# Altium footprint library UP-ROBOT Devices(2013-02-26).PcbLib: 150 footprints (part 2 of 10)
Each footprint in its own frame and in the unit in brackets; x right, y up, seen from the top. Pads: shape width x height; smd on the part's side, far side on the other; paste and mask are expansions set on the pad; w line width, h text height; cw(c..) or ccw(c..) is an arc to the next point about the centre after c.
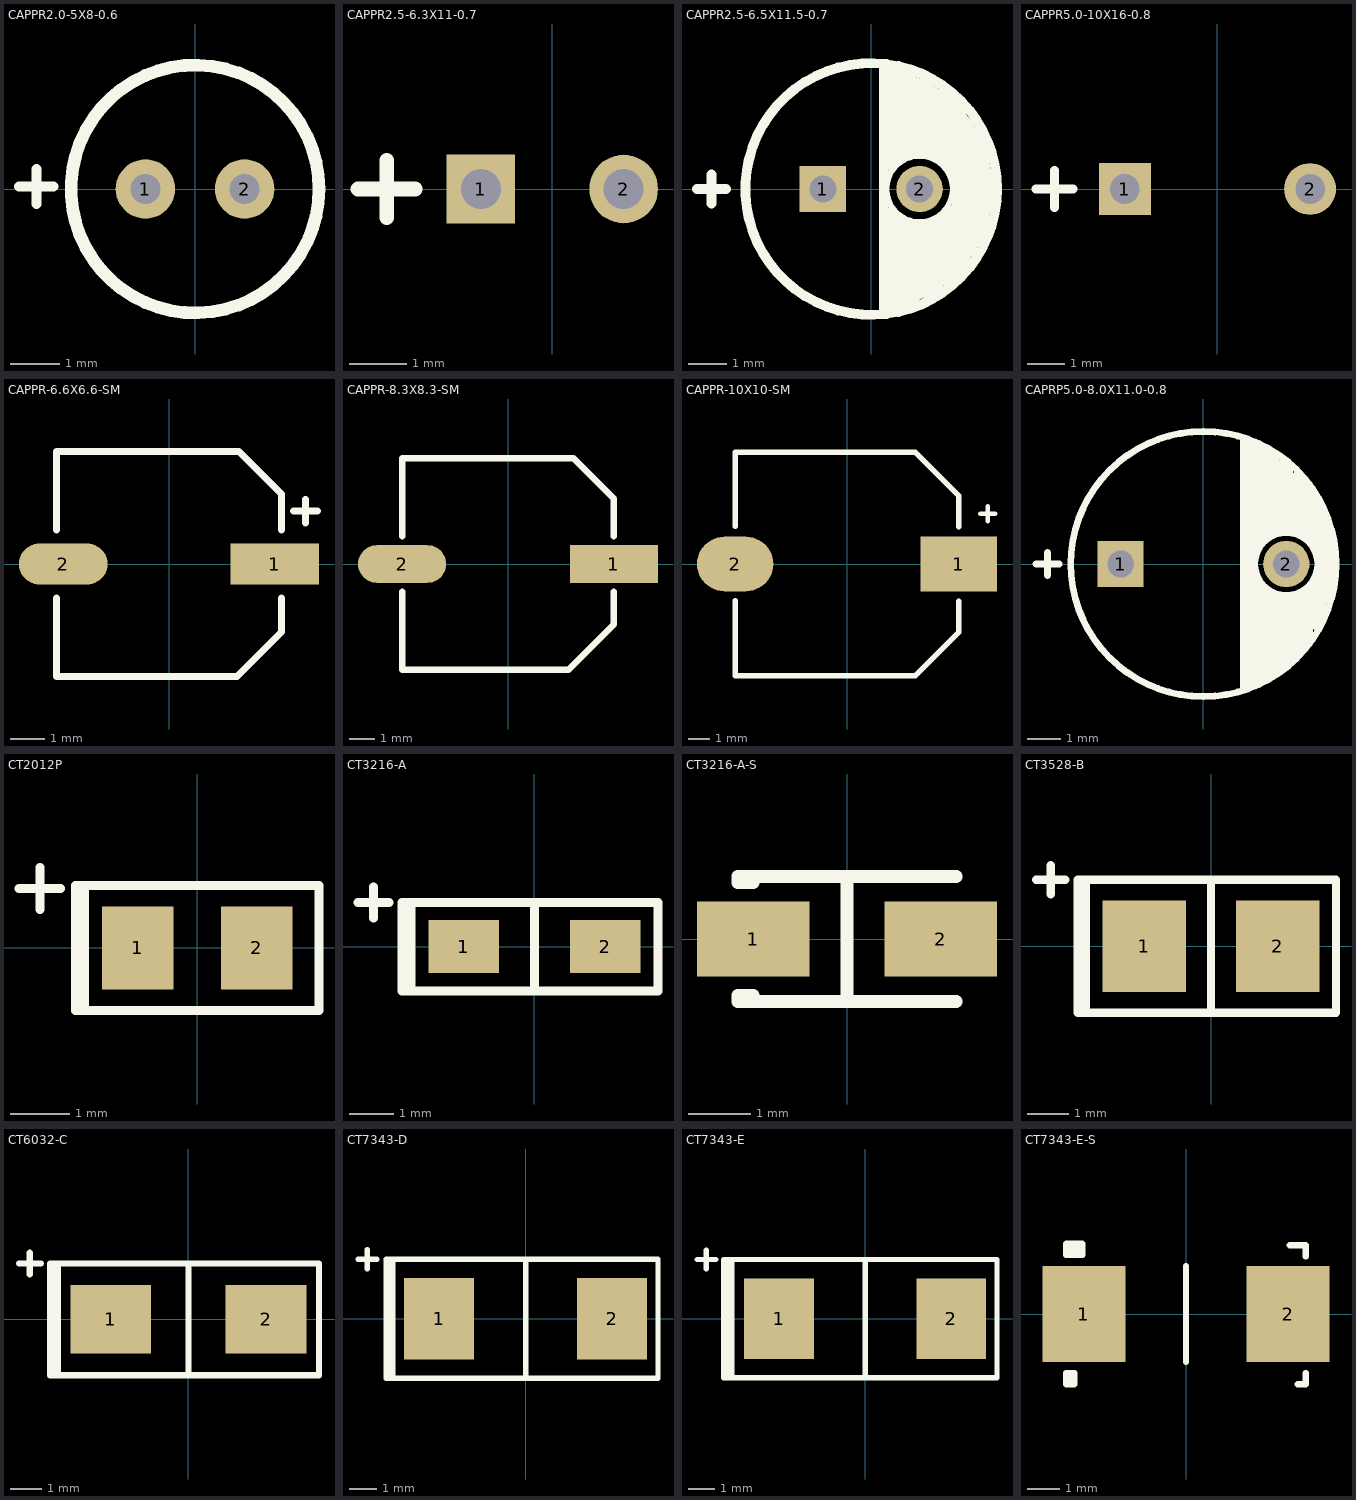
[diagram p1: the footprints below, top view; thin cyan lines are the x and y axes]

## CAPPR2.0-5X8-0.6 [mm]
pads (2):
  round 1.2 hole 0.6: 1(-1,0) 2(1,0)
Top Overlay:
  circle w0.254: c0,0 r2.5
  lines w0.203: -3.55,0.05 -3.2,0.05 ; -3.2,-0.3 -3.2,0.05 ; -3.2,0.4 -3.2,0.05 ; -2.85,0.05 -3.2,0.05
3D body: height 8, standoff -1.28, extent -2.5,-2.5 2.5,2.499

## CAPPR2.5-6.3X11-0.7 [mm]
pads (2):
  rect 1.2x1.2 hole 0.7: 1(-1.25,0)
  round 1.2 hole 0.7: 2(1.25,0)
Top Overlay:
  lines w0.254: -3.4,0 -2.4,0 ; -2.9,-0.5 -2.9,0.5

## CAPPR2.5-6.5X11.5-0.7 [mm]
pads (2):
  rect 1.2x1.2 hole 0.7: 1(-1.25,0)
  round 1.2 hole 0.7: 2(1.25,0)
Top Overlay:
  circle w0.15: c1.25,0 r0.855
  circle w0.254: c0,0 r3.25
  rectangle: 0.5,-3.075 0.825,-2.975
  rectangle: 0.5,-2.075 1.8,-1.175
  rectangle: 1.9,-0.65 2.125,-0.425
  rectangle: 1.725,-0.825 2.05,-0.65
  rectangle: 1.725,0.625 1.95,0.85
  rectangle: 1.925,0.4 2.1,0.85
  rectangle: 0.5,1 2.075,2.1
  rectangle: 0.55,2.8 1.025,3.075
  rectangle: 0.45,-1.25 3.05,-0.775
  rectangle: 0.475,0.775 3.075,1.25
  region: 0.75,-0.65 0.475,-0.65 0.475,-1 0.75,-1
  rectangle: 0.475,0.65 0.75,1
  rectangle: 0.45,-3.1 0.575,-0.475
  rectangle: 0.45,0.475 0.575,3.1
  lines w0.254: -4.5,0 -3.75,0 ; -4.125,-0.375 -4.125,0.375 ; 0.325,-3.225 0.325,3.2
  lines w1: 0.704,-2.53 ccw(c0,0) 0.889,2.471

## CAPPR5.0-10X16-0.8 [mm]
pads (2):
  rect 1.4x1.4 hole 0.8: 1(-2.5,0)
  round 1.4 hole 0.8: 2(2.5,0)
Top Overlay:
  lines w0.254: -4.9,0 -3.9,0 ; -4.4,-0.5 -4.4,0.5

## CAPPR-6.6X6.6-SM [mm]
pads (2):
  rect 2.6x1.2 smd: 1(3.1,0)
  oval 2.6x1.2 smd: 2(-3.1,0)
Top Overlay:
  lines w0.203: -3.3,-1 -3.3,-3.3 2,-3.3 3.3,-2 3.3,-1 ; -3.3,1 -3.3,3.3 2.05,3.3 3.3,2.05 3.3,1 ; 3.65,1.55 4,1.55 ; 4,1.2 4,1.55 ; 4,1.9 4,1.55 ; 4.35,1.55 4,1.55
3D body: height 8, standoff 0, extent -3.656,-3.05 3.456,3.1

## CAPPR-8.3X8.3-SM [mm]
pads (2):
  rect 3.5x1.5 smd: 1(4.2,0)
  oval 3.5x1.5 smd: 2(-4.2,0)
Top Overlay:
  lines w0.254: -4.2,-1.1 -4.2,-4.2 2.3,-4.2 2.4,-4.2 4.2,-2.4 4.2,-1.1 ; -4.2,1.1 -4.2,4.2 2.3,4.2 2.6,4.2 4.2,2.6 4.2,2.4 4.2,1.1

## CAPPR-10X10-SM [mm]
pads (2):
  rect 3.5x2.5 smd: 1(5.125,0)
  oval 3.5x2.5 smd: 2(-5.125,0)
Top Overlay:
  lines w0.203: 6.1,2.3 6.45,2.3 ; 6.45,1.95 6.45,2.3 ; 6.45,2.65 6.45,2.3 ; 6.8,2.3 6.45,2.3
  lines w0.254: -5.125,-1.675 -5.125,-5.125 3.125,-5.125 5.125,-3.125 5.125,-1.7 ; -5.125,1.725 -5.125,5.125 3.125,5.125 5.125,3.125 5.125,1.7
3D body: height 11, standoff 0, extent -5.918,-5.105 5.936,5.145

## CAPRP5.0-8.0X11.0-0.8 [mm]
pads (2):
  rect 1.4x1.4 hole 0.8: 1(-2.5,0)
  round 1.4 hole 0.8: 2(2.5,0)
Top Overlay:
  circle w0.5: c2.5,0 r1.1
  circle w0.203: c0,0 r4
  lines w0.203: -5.05,0 -4.7,0 ; -4.7,-0.35 -4.7,0 ; -4.7,0.35 -4.7,0 ; -4.35,0 -4.7,0 ; 1.2,-3.8 1.2,3.8 ; 1.3,-3.6 1.7,-3.6 ; 1.4,-3.6 1.4,3.7 ; 1.4,-3.4 2.1,-3.4 2.5,-3 2.5,-1.3 ; 1.6,-3.4 1.6,-0.8 ; 1.6,0.8 1.6,3.6 ; 1.7,-3.4 1.7,-0.9 ; 1.8,-3.4 1.8,-1 ; 1.8,1 1.8,3.5 ; 2,-3.3 2,-1.1 ; 2,1.1 2,3.4 ; 2.1,-3.2 2.1,-1.2 ; 2.2,1.2 2.2,3.3 ; 2.3,-3.2 2.3,-1.2 ; 2.4,1.2 2.4,3.1 ; 2.6,1.2 2.6,3 ; 2.7,-2.9 2.7,-1.2 ; 2.8,-2.8 2.8,-1.2 ; 2.8,1.2 2.8,2.7 ; 3,-2.6 3,-1.1 ; 3,1 3,2.6 ; 3.2,-2.4 3.2,-1 ; 3.2,0.9 3.2,2.4 ; 3.4,-1.9 3.4,-0.8 ; 3.4,0.7 3.4,2 ; 3.6,-1.7 3.6,1.7 ; 3.7,-1.1 3.7,1.2 ; 3.9,-0.8 3.9,0.8
3D body: height 12.5, standoff -2, extent -4,-4 4,4

## CT2012P [mm]
pads (2):
  rect 1.2x1.4 smd: 1(-1,0) 2(1,0)
Top Overlay:
  lines w0.152: -3,1 -2.3,1 ; -2.65,0.65 -2.65,1.35 ; -1.9,-1.05 -1.9,1.05 ; -2.05,-1.05 -2.05,1.05 2.05,1.05 2.05,-1.05 -2.05,-1.05
3D body: height 0.81, standoff 0, extent -1.25,-0.65 1.25,0.65

## CT3216-A [mm]
height 3.6
pads (2):
  rect 1.6x1.2 smd: 1(-1.6,0) 2(1.6,0)
Top Overlay:
  rectangle: -3.031,-1 -2.7,1
  lines w0.203: -4,1 -3.65,1 ; -3.65,0.65 -3.65,1 ; -3.65,1.35 -3.65,1 ; -3.3,1 -3.65,1 ; 0,-1 0,1 ; -3,-1 2.8,-1 2.8,1 -3,1 -3,-1
3D body: height 1.6, standoff 0, extent -1.651,-0.813 1.752,0.787

## CT3216-A-S [mm]
height 3.6
pads (2):
  rect 1.8x1.2 smd: 1(-1.5,0) 2(1.5,0)
Top Overlay:
  lines w0.2: -1.75,-1 -1.75,-0.9 -1.5,-0.9 ; -1.75,1 -1.75,0.9 -1.5,0.9
  lines w0.203: -1.75,-1 1.75,-1 ; -1.75,1 1.75,1 ; 0,-1 0,1
3D body: height 1.6, standoff 0, extent -1.701,-0.813 1.702,0.787

## CT3528-B [mm]
pads (2):
  rect 2x2.2 smd: 1(-1.6,0) 2(1.6,0)
Top Overlay:
  rectangle: -3.2,-1.5 -2.9,1.5
  lines w0.203: -4.2,1.6 -3.85,1.6 ; -3.85,1.25 -3.85,1.6 ; -3.85,1.95 -3.85,1.6 ; -3.5,1.6 -3.85,1.6 ; 0,-1.6 0,1.5 ; -3.2,-1.6 -3.2,1.6 3,1.6 3,-1.6 -3.2,-1.6
3D body: height 1.9, standoff 0, extent -1.75,-1.4 1.75,1.4

## CT6032-C [mm]
pads (2):
  rect 2.6x2.2 smd: 1(-2.5,0) 2(2.5,0)
Top Overlay:
  rectangle: -4.481,-1.7 -4.1,1.8
  lines w0.203: -5.45,1.8 -5.1,1.8 ; -5.1,1.45 -5.1,1.8 ; -5.1,2.15 -5.1,1.8 ; -4.75,1.8 -5.1,1.8 ; 0,-1.7 0,1.8 ; -4.45,-1.8 -4.45,1.8 4.2,1.8 4.2,-1.8 -4.45,-1.8

## CT7343-D [mm]
pads (2):
  rect 2.6x3 smd: 1(-3.2,0) 2(3.2,0)
Top Overlay:
  rectangle: -5.2,-2.1 -4.819,2.2
  lines w0.203: -6.2,2.2 -5.85,2.2 ; -5.85,1.85 -5.85,2.2 ; -5.85,2.55 -5.85,2.2 ; -5.5,2.2 -5.85,2.2 ; 0,-2.1 0,2.1 ; -5.15,-2.2 4.9,-2.2 4.9,2.2 -5.15,2.2 -5.15,-2.2
3D body: height 2.8, standoff 0, extent -3.746,-2.159 3.746,2.159

## CT7343-E [mm]
pads (2):
  rect 2.6x3 smd: 1(-3.2,0) 2(3.2,0)
Top Overlay:
  rectangle: -5.231,-2.1 -4.85,2.2
  lines w0.203: -6.25,2.2 -5.9,2.2 ; -5.9,1.85 -5.9,2.2 ; -5.9,2.55 -5.9,2.2 ; -5.55,2.2 -5.9,2.2 ; 0,-2.1 0,2.1 ; -5.25,-2.2 4.9,-2.2 4.9,2.2 -5.25,2.2 -5.25,-2.2
3D body: height 4, standoff 0, extent -3.746,-2.2 3.746,2.118

## CT7343-E-S [mm]
pads (2):
  rect 2.6x3 smd: 1(-3.2,0) 2(3.2,0)
Top Overlay:
  rectangle: -3.75,1.85 -3.25,2.2
  rectangle: -3.75,-2.2 -3.5,-1.85
  lines w0.2: -3.75,-2.2 -3.75,-1.85 -3.5,-1.85 -3.5,-2.2 ; -3.75,2.2 -3.75,1.85 -3.25,1.85 -3.25,2.2 ; 3.75,-2.2 3.75,-1.85 ; 3.75,1.8 3.75,2.15
  lines w0.203: -3.75,-2.2 -3.5,-2.2 ; -3.75,2.2 -3.25,2.2 ; 0,-1.5 0,1.5 ; 3.25,2.15 3.75,2.15 ; 3.5,-2.2 3.75,-2.2
3D body: height 4, standoff 0, extent -3.746,-2.2 3.746,2.118